# Altium footprint library Passive Pad Lib.PcbLib: 110 footprints (part 4 of 7)
Each footprint in its own frame and in the unit in brackets; x right, y up, seen from the top. Pads: shape width x height; smd on the part's side, far side on the other; paste and mask are expansions set on the pad; w line width, h text height; cw(c..) or ccw(c..) is an arc to the next point about the centre after c.
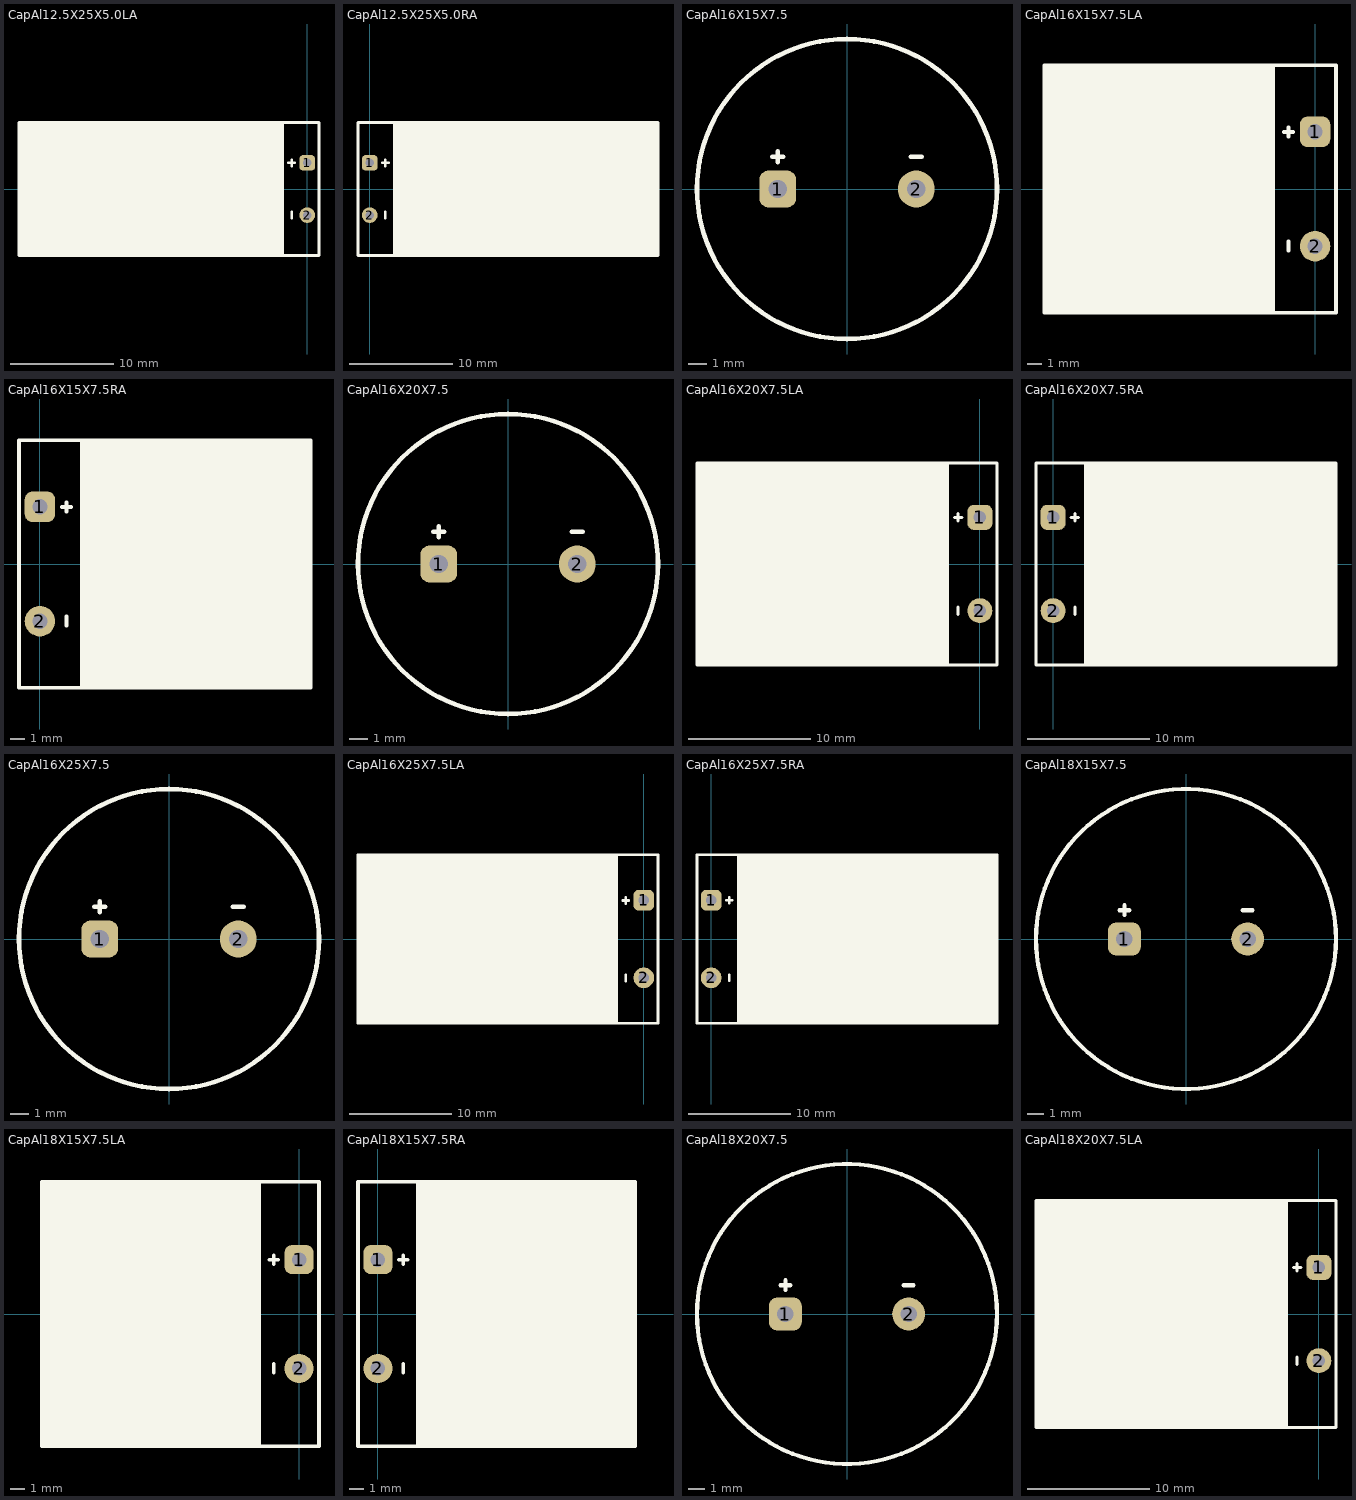
[diagram p3: the footprints below, top view; thin cyan lines are the x and y axes]

## CapAl12.5X25X5.0LA [mil] "Aluminum Electrolytic Capacitors (Size:12.5X25X5.0mm, Angled Left)"
pads (2):
  rrect50% 60x60 hole 32: 1(0,100)
  round 60 hole 32: 2(0,-100)
Top Overlay:
  region: -90,-255 -90,255 -1105,255 -1105,-255
  lines w10: -72,100 -48,100 ; -60,-112 -60,-88 ; -60,88 -60,112 ; -1105,-255 45,-255 45,255 -1105,255 -1105,-255
3D body "THD Capacitor Polar 12.5x25x5mm LA.step": height 502.06, standoff -99.33, extent -1102.93,-247.07 12.32,247.06

## CapAl12.5X25X5.0RA [mil] "Aluminum Electrolytic Capacitors (Size:12.5X25X5.0mm, Angled Right)"
pads (2):
  rrect50% 60x60 hole 32: 1(0,100)
  round 60 hole 32: 2(0,-100)
Top Overlay:
  region: 89.5,255 89.5,-255 1105,-255 1105,255
  lines w10: 48,100 72,100 ; 60,-112 60,-88 ; 60,88 60,112 ; -45,-255 -45,255 1105,255 1105,-255 -45,-255
3D body "THD Capacitor Polar 12.5x25x5mm RA.step": height 497.06, standoff -104.33, extent -12.15,-247.07 1102.94,247.06

## CapAl16X15X7.5 [mil] "Aluminum Electrolytic Capacitors (Size:16X15X7.5mm,Straight)"
pads (2):
  rrect50% 80x80 hole 40: 1(-150,0)
  round 80 hole 40: 2(150,0)
Top Overlay:
  circle w10: c0,0 r325
  lines w10: -162,70 -138,70 ; -150,58 -150,82 ; 138,70 162,70
3D body "THD Capacitor Polar 16x15x7.5mm.step": height 606.24, standoff -133.81, extent -315.96,-315.96 315.96,315.96

## CapAl16X15X7.5LA [mil] "Aluminum Electrolytic Capacitors (Size:16X15X7.5mm, Angled Left)"
pads (2):
  rrect50% 80x80 hole 40: 1(0,150)
  round 80 hole 40: 2(0,-150)
Top Overlay:
  region: -105,-325 -105,325 -710,325 -710,-325
  lines w10: -82,150 -58,150 ; -70,-162 -70,-138 ; -70,138 -70,162 ; -710,-325 55,-325 55,325 -710,325 -710,-325
3D body "THD Capacitor Polar 16x15x7.5mm LA.step": height 640.96, standoff -108.07, extent -709.23,-315.96 16.26,315.96

## CapAl16X15X7.5RA [mil] "Aluminum Electrolytic Capacitors (Size:16X15X7.5mm, Angled Right)"
pads (2):
  rrect50% 80x80 hole 40: 1(0,150)
  round 80 hole 40: 2(0,-150)
Top Overlay:
  region: 105,325 105,-325 710,-325 710,325
  lines w10: 58,150 82,150 ; 70,-162 70,-138 ; 70,138 70,162 ; -55,-325 710,-325 710,325 -55,325 -55,-325
3D body "THD Capacitor Polar 16x15x7.5mm RA.step": height 640.96, standoff -108.07, extent -16.09,-315.96 709.24,315.96

## CapAl16X20X7.5 [mil] "Aluminum Electrolytic Capacitors (Size:16X20X7.5mm,Straight)"
pads (2):
  rrect50% 80x80 hole 40: 1(-150,0)
  round 80 hole 40: 2(150,0)
Top Overlay:
  circle w10: c0,0 r325
  lines w10: -162,70 -138,70 ; -150,58 -150,82 ; 138,70 162,70
3D body "THD Capacitor Polar 16x20x7.5mm.step": height 803.09, standoff -133.81, extent -315.96,-315.96 315.96,315.96

## CapAl16X20X7.5LA [mil] "Aluminum Electrolytic Capacitors (Size:16X20X7.5mm, Angled Left)"
pads (2):
  rrect50% 80x80 hole 40: 1(0,150)
  round 80 hole 40: 2(0,-150)
Top Overlay:
  region: -100,-325 -100,325 -910,325 -910,-325
  lines w10: -82,150 -58,150 ; -70,-162 -70,-138 ; -70,138 -70,162 ; -910,-325 -910,325 55,325 55,-325 -910,-325
3D body "THD Capacitor Polar 16x20x7.5mm LA.step": height 640.96, standoff -108.07, extent -906.08,-315.96 16.26,315.96

## CapAl16X20X7.5RA [mil] "Aluminum Electrolytic Capacitors (Size:16X20X7.5mm, Angled Right)"
pads (2):
  rrect50% 80x80 hole 40: 1(0,150)
  round 80 hole 40: 2(0,-150)
Top Overlay:
  region: 100,325 100,-325 910,-325 910,325
  lines w10: 58,150 82,150 ; 70,-162 70,-138 ; 70,138 70,162 ; -55,-325 -55,325 910,325 910,-325 -55,-325
3D body "THD Capacitor Polar 16x20x7.5mm RA.step": height 640.96, standoff -108.07, extent -16.09,-315.96 906.09,315.96

## CapAl16X25X7.5 [mil] "Aluminum Electrolytic Capacitors (Size:16X25X7.5mm,Straight)"
pads (2):
  rrect50% 80x80 hole 40: 1(-150,0)
  round 80 hole 40: 2(150,0)
Top Overlay:
  circle w10: c0,0 r325
  lines w10: -162,70 -138,70 ; -150,58 -150,82 ; 138,70 162,70
3D body "THD Capacitor Polar 16x25x7.5mm.step": height 999.94, standoff -133.81, extent -315.96,-315.96 315.96,315.96

## CapAl16X25X7.5LA [mil] "Aluminum Electrolytic Capacitors (Size:16X25X7.5mm, Angled Left)"
pads (2):
  rrect50% 80x80 hole 40: 1(0,150)
  round 80 hole 40: 2(0,-150)
Top Overlay:
  region: -100,-325 -100,325 -1105,325 -1105,-325
  lines w10: -82,149 -58,149 ; -70,-163 -70,-139 ; -70,137 -70,161 ; -1105,-325 55,-325 55,325 -1105,325 -1105,-325
3D body "THD Capacitor Polar 16x25x7.5mm LA.step": height 640.96, standoff -108.07, extent -1102.93,-315.96 16.26,315.96

## CapAl16X25X7.5RA [mil] "Aluminum Electrolytic Capacitors (Size:16X25X7.5mm, Angled Right)"
pads (2):
  rrect50% 80x80 hole 40: 1(0,150)
  round 80 hole 40: 2(0,-150)
Top Overlay:
  region: 100,325 100,-325 1105,-325 1105,325
  lines w10: 58,150 82,150 ; 70,-162 70,-138 ; 70,138 70,162 ; -55,-325 -55,325 1105,325 1105,-325 -55,-325
3D body "THD Capacitor Polar 16x25x7.5mm RA.step": height 640.96, standoff -108.07, extent -16.09,-315.96 1102.94,315.96

## CapAl18X15X7.5 [mil] "Aluminum Electrolytic Capacitors (Size:18X15X7.5mm,Straight)"
pads (2):
  rrect50% 80x80 hole 40: 1(-150,0)
  round 80 hole 40: 2(150,0)
Top Overlay:
  circle w10: c0,0 r365
  lines w10: -162,70 -138,70 ; -150,58 -150,82 ; 138,70 162,70
3D body "THD Capacitor Polar 18x15x7.5mm.step": height 606.24, standoff -133.81, extent -355.33,-355.33 355.33,355.33

## CapAl18X15X7.5LA [mil] "Aluminum Electrolytic Capacitors (Size:18X15X7.5mm, Angled Left)"
pads (2):
  rrect50% 80x80 hole 40: 1(0,150)
  round 80 hole 40: 2(0,-150)
Top Overlay:
  region: -105,-365 -105,365 -710,365 -710,-365
  lines w10: -82,150 -58,150 ; -70,-162 -70,-138 ; -70,138 -70,162 ; -710,-365 55,-365 55,365 -710,365 -710,-365
3D body "THD Capacitor Polar 18x15x7.5mm LA.step": height 715.33, standoff -112.44, extent -709.23,-355.33 16.26,355.33

## CapAl18X15X7.5RA [mil] "Aluminum Electrolytic Capacitors (Size:18X15X7.5mm, Angled Right)"
pads (2):
  rrect50% 80x80 hole 40: 1(0,150)
  round 80 hole 40: 2(0,-150)
Top Overlay:
  region: 105,365 105,-365 710,-365 710,365
  lines w10: 58,150 82,150 ; 70,-162 70,-138 ; 70,138 70,162 ; -55,-365 710,-365 710,365 -55,365 -55,-365
3D body "THD Capacitor Polar 18x15x7.5mm RA.step": height 715.33, standoff -112.44, extent -16.09,-355.33 709.24,355.33

## CapAl18X20X7.5 [mil] "Aluminum Electrolytic Capacitors (Size:18X20X7.5mm,Straight)"
pads (2):
  rrect50% 80x80 hole 40: 1(-150,0)
  round 80 hole 40: 2(150,0)
Top Overlay:
  circle w10: c0,0 r365
  lines w10: -162,70 -138,70 ; -150,58 -150,82 ; 138,70 162,70
3D body "THD Capacitor Polar 18x20x7.5mm.step": height 803.09, standoff -133.81, extent -355.33,-355.33 355.33,355.33

## CapAl18X20X7.5LA [mil] "Aluminum Electrolytic Capacitors (Size:18X20X7.5mm, Angled Left)"
pads (2):
  rrect50% 80x80 hole 40: 1(0,150)
  round 80 hole 40: 2(0,-150)
Top Overlay:
  region: -100,-365 -100,365 -910,365 -910,-365
  lines w10: -82,150 -58,150 ; -70,-162 -70,-138 ; -70,138 -70,162 ; -910,-365 55,-365 55,365 -910,365 -910,-365
3D body "THD Capacitor Polar 18x20x7.5mm LA.step": height 715.33, standoff -112.44, extent -906.08,-355.33 16.26,355.33